# Altium schematic symbol library 16.3 - TTL74系列.SchLib: 649 symbols (part 4 of 6) (continued)
## SN74LS78A (continued)
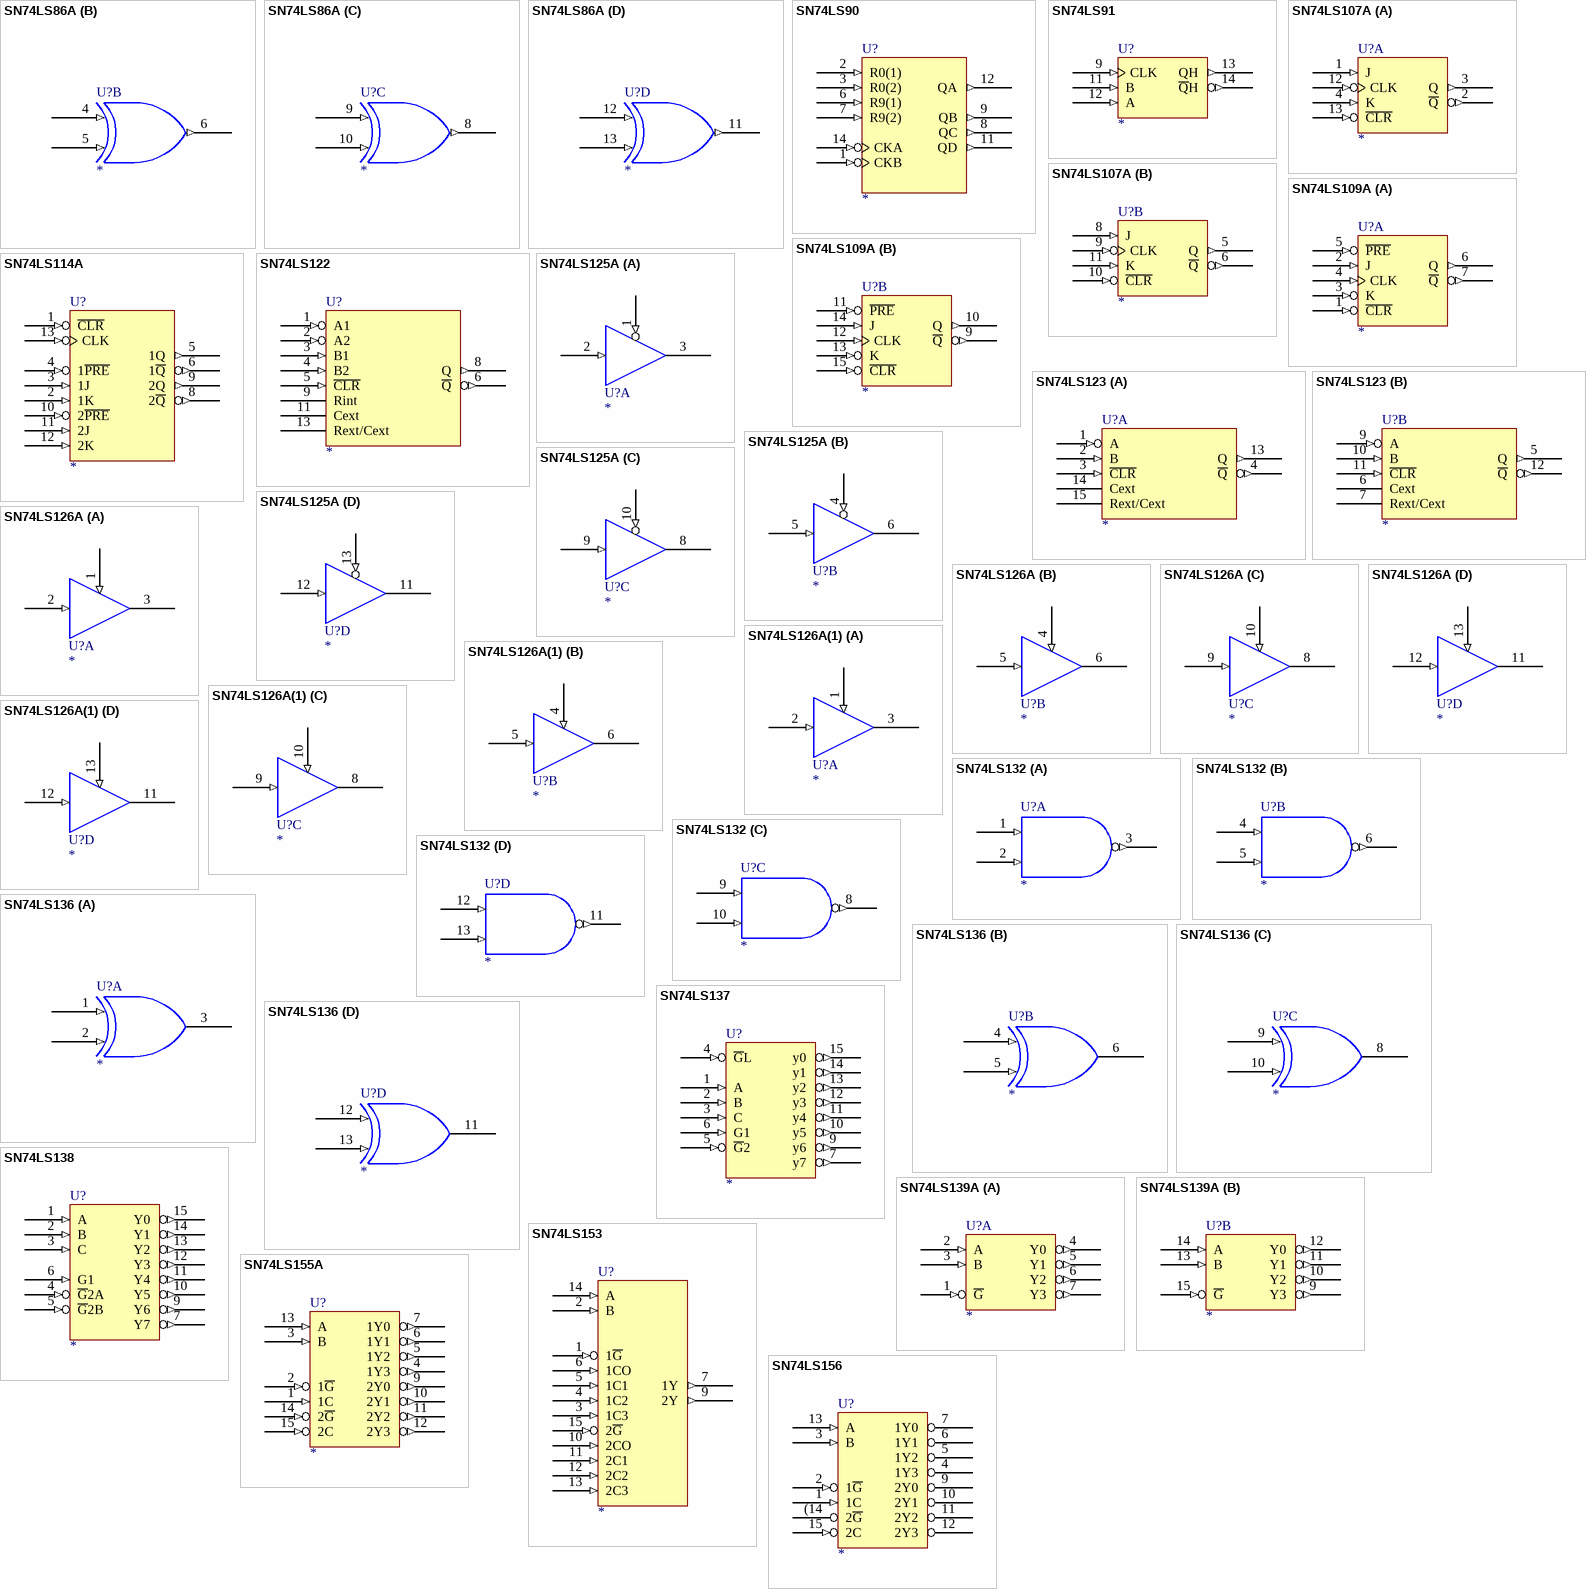
[diagram p19: symbols SN74LS86A to SN74LS156]

## SN74LS86A
designator U?
QUAD 2-IN XOR  G
footprint SO14
footprint DIP-14
part A pins: 1 (in), 2 (in), 3 (out), 7 GND (power) hidden to GND, 14 VCC (power) hidden to VCC
part B pins: 4 (in), 5 (in), 6 (out), 7 GND (power) hidden to GND, 14 VCC (power) hidden to VCC
part C pins: 7 GND (power) hidden to GND, 8 (out), 9 (in), 10 (in), 14 VCC (power) hidden to VCC
part D pins: 7 GND (power) hidden to GND, 11 (out), 12 (in), 13 (in), 14 VCC (power) hidden to VCC
1 alternate drawing of the same symbol

## SN74LS90
designator U?
DECADE DIV-BY-12 BIN CNT
footprint SO14
footprint DIP-14
pins: 1 CKB (in), 2 R0(1) (in), 3 R0(2) (in), 5 VCC (power) hidden to VCC, 6 R9(1) (in), 7 R9(2) (in), 8 QC (out), 9 QB (out), 10 GND (power) hidden to GND, 11 QD (out), 12 QA (out), 14 CKA (in)
1 alternate drawing of the same symbol

## SN74LS91
designator U?
8-BIT SHIFT REG
footprint SO14
footprint DIP-14
pins: 5 VCC (power) hidden to VCC, 9 CLK (in), 10 GND (power) hidden to GND, 11 B (in), 12 A (in), 13 QH (out), 14 ~{Q}H (out)
1 alternate drawing of the same symbol

## SN74LS107A
designator U?
DUAL J-K FF CR
footprint SO14
footprint DIP-14
part A pins: 1 J (in), 2 ~{Q} (out), 3 Q (out), 4 K (in), 7 GND (power) hidden to GND, 12 CLK (in), 13 ~{CLR} (in), 14 VCC (power) hidden to VCC
part B pins: 5 Q (out), 6 ~{Q} (out), 7 GND (power) hidden to GND, 8 J (in), 9 CLK (in), 10 ~{CLR} (in), 11 K (in), 14 VCC (power) hidden to VCC
1 alternate drawing of the same symbol

## SN74LS109A
designator U?
DUAL J-K PET FF RS CR
footprint SO16
footprint DIP-16
part A pins: 1 ~{CLR} (in), 2 J (in), 3 K (in), 4 CLK (in), 5 ~{PRE} (in), 6 Q (out), 7 ~{Q} (out), 8 GND (power) hidden to GND, 16 VCC (power) hidden to VCC
part B pins: 8 GND (power) hidden to GND, 9 ~{Q} (out), 10 Q (out), 11 ~{PRE} (in), 12 CLK (in), 13 K (in), 14 J (in), 15 ~{CLR} (in), 16 VCC (power) hidden to VCC
1 alternate drawing of the same symbol

## SN74LS114A
designator U?
DUAL J-K NET FF RS COM CR COM CLK
footprint SO14
footprint DIP-14
pins: 1 ~{CLR} (in), 2 1K (in), 3 1J (in), 4 1~{PRE} (in), 5 1Q (out), 6 1~{Q} (out), 7 GND (power) hidden to GND, 8 2~{Q} (out), 9 2Q (out), 10 2~{PRE} (in), 11 2J (in), 12 2K (in), 13 CLK (in), 14 VCC (power) hidden to VCC
1 alternate drawing of the same symbol

## SN74LS122
designator U?
RETRIGGERABLE MONOSTABLE MULTIVIBRATOR
footprint SO14
footprint DIP-14
pins: 1 A1 (in), 2 A2 (in), 3 B1 (in), 4 B2 (in), 5 ~{CLR} (in), 6 ~{Q} (out), 7 GND (power) hidden to GND, 8 Q (out), 9 Rint, 11 Cext, 13 Rext/Cext, 14 VCC (power) hidden to VCC
1 alternate drawing of the same symbol

## SN74LS123
designator U?
RETRIGGERABLE MONOSTABLE MULTIVIBRATOR
footprint SO16
footprint DIP-16
part A pins: 1 A (in), 2 B (in), 3 ~{CLR} (in), 4 ~{Q} (out), 8 GND (power) hidden to GND, 13 Q (out), 14 Cext, 15 Rext/Cext, 16 VCC (power) hidden to VCC
part B pins: 5 Q (out), 6 Cext, 7 Rext/Cext, 8 GND (power) hidden to GND, 9 A (in), 10 B (in), 11 ~{CLR} (in), 12 ~{Q} (out), 16 VCC (power) hidden to VCC
1 alternate drawing of the same symbol

## SN74LS125A
designator U?
QUAD BUS BUF 3SO
footprint SO14
footprint DIP-14
part A pins: 1 (in), 2 (in), 3 (hiz), 7 GND (power) hidden to GND, 14 VCC (power) hidden to VCC
part B pins: 4 (in), 5 (in), 6 (hiz), 7 GND (power) hidden to GND, 14 VCC (power) hidden to VCC
part C pins: 7 GND (power) hidden to GND, 8 (hiz), 9 (in), 10 (in), 14 VCC (power) hidden to VCC
part D pins: 7 GND (power) hidden to GND, 11 (hiz), 12 (in), 13 (in), 14 VCC (power) hidden to VCC
2 alternate drawings of the same symbol

## SN74LS126A
designator U?
QUAD BUS BUF 3SO
footprint SO14
footprint DIP-14
part A pins: 1 (in), 2 (in), 3 (hiz), 7 GND (power) hidden to GND, 14 VCC (power) hidden to VCC
part B pins: 4 (in), 5 (in), 6 (hiz), 7 GND (power) hidden to GND, 14 VCC (power) hidden to VCC
part C pins: 7 GND (power) hidden to GND, 8 (hiz), 9 (in), 10 (in), 14 VCC (power) hidden to VCC
part D pins: 7 GND (power) hidden to GND, 11 (hiz), 12 (in), 13 (in), 14 VCC (power) hidden to VCC
2 alternate drawings of the same symbol

## SN74LS126A(1)
designator U?
QUAD BUS BUF 3SO
footprint DIP-14
part A pins: 1 (in), 2 (in), 3 (hiz), 7 GND (power) hidden to GND, 14 VCC (power) hidden to VCC
part B pins: 4 (in), 5 (in), 6 (hiz), 7 GND (power) hidden to GND, 14 VCC (power) hidden to VCC
part C pins: 7 GND (power) hidden to GND, 8 (hiz), 9 (in), 10 (in), 14 VCC (power) hidden to VCC
part D pins: 7 GND (power) hidden to GND, 11 (hiz), 12 (in), 13 (in), 14 VCC (power) hidden to VCC
2 alternate drawings of the same symbol

## SN74LS132
designator U?
QUAD 2-IN POS NAND SCH
footprint SO14
footprint DIP-14
part A pins: 1 (in), 2 (in), 3 (out), 7 GND (power) hidden to GND, 14 VCC (power) hidden to VCC
part B pins: 4 (in), 5 (in), 6 (out), 7 GND (power) hidden to GND, 14 VCC (power) hidden to VCC
part C pins: 7 GND (power) hidden to GND, 8 (out), 9 (in), 10 (in), 14 VCC (power) hidden to VCC
part D pins: 7 GND (power) hidden to GND, 11 (out), 12 (in), 13 (in), 14 VCC (power) hidden to VCC
2 alternate drawings of the same symbol

## SN74LS136
designator U?
QUAD 2-IN XOR  G OCO
footprint DIP-14
part A pins: 1 (in), 2 (in), 3 (oc), 7 GND (power) hidden to GND, 14 VCC (power) hidden to VCC
part B pins: 4 (in), 5 (in), 6 (oc), 7 GND (power) hidden to GND, 14 VCC (power) hidden to VCC
part C pins: 7 GND (power) hidden to GND, 8 (oc), 9 (in), 10 (in), 14 VCC (power) hidden to VCC
part D pins: 7 GND (power) hidden to GND, 11 (oc), 12 (in), 13 (in), 14 VCC (power) hidden to VCC
1 alternate drawing of the same symbol

## SN74LS137
designator U?
3-8LINE DEC/DEMUL ADDRESS LCH
footprint SO16
footprint DIP-16
pins: 1 A (in), 2 B (in), 3 C (in), 4 ~{G}L (in), 5 ~{G}2 (in), 6 G1 (in), 7 y7 (out), 8 GND (power) hidden to GND, 9 y6 (out), 10 y5 (out), 11 y4 (out), 12 y3 (out), 13 y2 (out), 14 y1 (out), 15 y0 (out), 16 VCC (power) hidden to VCC
1 alternate drawing of the same symbol

## SN74LS138
designator U?
3-8LINE DEC/DEMUL
footprint SO16
footprint DIP-16
pins: 1 A (in), 2 B (in), 3 C (in), 4 ~{G}2A (in), 5 ~{G}2B (in), 6 G1 (in), 7 Y7 (out), 8 GND (power) hidden to GND, 9 Y6 (out), 10 Y5 (out), 11 Y4 (out), 12 Y3 (out), 13 Y2 (out), 14 Y1 (out), 15 Y0 (out), 16 VCC (power) hidden to VCC
1 alternate drawing of the same symbol

## SN74LS139A
designator U?
DUAL 2-4LINE DEC/DEMULT
footprint SO16
footprint DIP-16
part A pins: 1 ~{G} (in), 2 A (in), 3 B (in), 4 Y0 (out), 5 Y1 (out), 6 Y2 (out), 7 Y3 (out), 8 GND (power) hidden to GND, 16 VCC (power) hidden to VCC
part B pins: 8 GND (power) hidden to GND, 9 Y3 (out), 10 Y2 (out), 11 Y1 (out), 12 Y0 (out), 13 B (in), 14 A (in), 15 ~{G} (in), 16 VCC (power) hidden to VCC
1 alternate drawing of the same symbol

## SN74LS153
designator U?
DUAL 4-1 LINE DATA SELEC/MUX
footprint SO16
footprint DIP-16
pins: 1 1~{G} (in), 2 B (in), 3 1C3 (in), 4 1C2 (in), 5 1C1 (in), 6 1CO (in), 7 1Y (out), 8 GND (power) hidden to GND, 9 2Y (out), 10 2CO (in), 11 2C1 (in), 12 2C2 (in), 13 2C3 (in), 14 A (in), 15 2~{G} (in), 16 VCC (power) hidden to VCC
1 alternate drawing of the same symbol

## SN74LS155A
designator U?
DUAL 2-4 LINE DEC/DEMUL
footprint SO16
footprint DIP-16
pins: 1 1C (in), 2 1~{G} (in), 3 B (in), 4 1Y3 (out), 5 1Y2 (out), 6 1Y1 (out), 7 1Y0 (out), 8 GND (power) hidden to GND, 9 2Y0 (out), 10 2Y1 (out), 11 2Y2 (out), 12 2Y3 (out), 13 A (in), 14 2~{G} (in), 15 2C (in), 16 VCC (power) hidden to VCC
1 alternate drawing of the same symbol

## SN74LS156
designator U?
DUAL 2-4 LINE DEC/DEMUL
footprint DIP-16
pins: 1 1C (in), 2 1~{G} (in), 3 B (in), 4 1Y3 (oc), 5 1Y2 (oc), 6 1Y1 (oc), 7 1Y0 (oc), 8 GND (power) hidden to GND, 9 2Y0 (oc), 10 2Y1 (oc), 11 2Y2 (oc), 12 2Y3 (oc), 13 A (in), 15 2C (in), 16 VCC (power) hidden to VCC, (14 2~{G}
1 alternate drawing of the same symbol

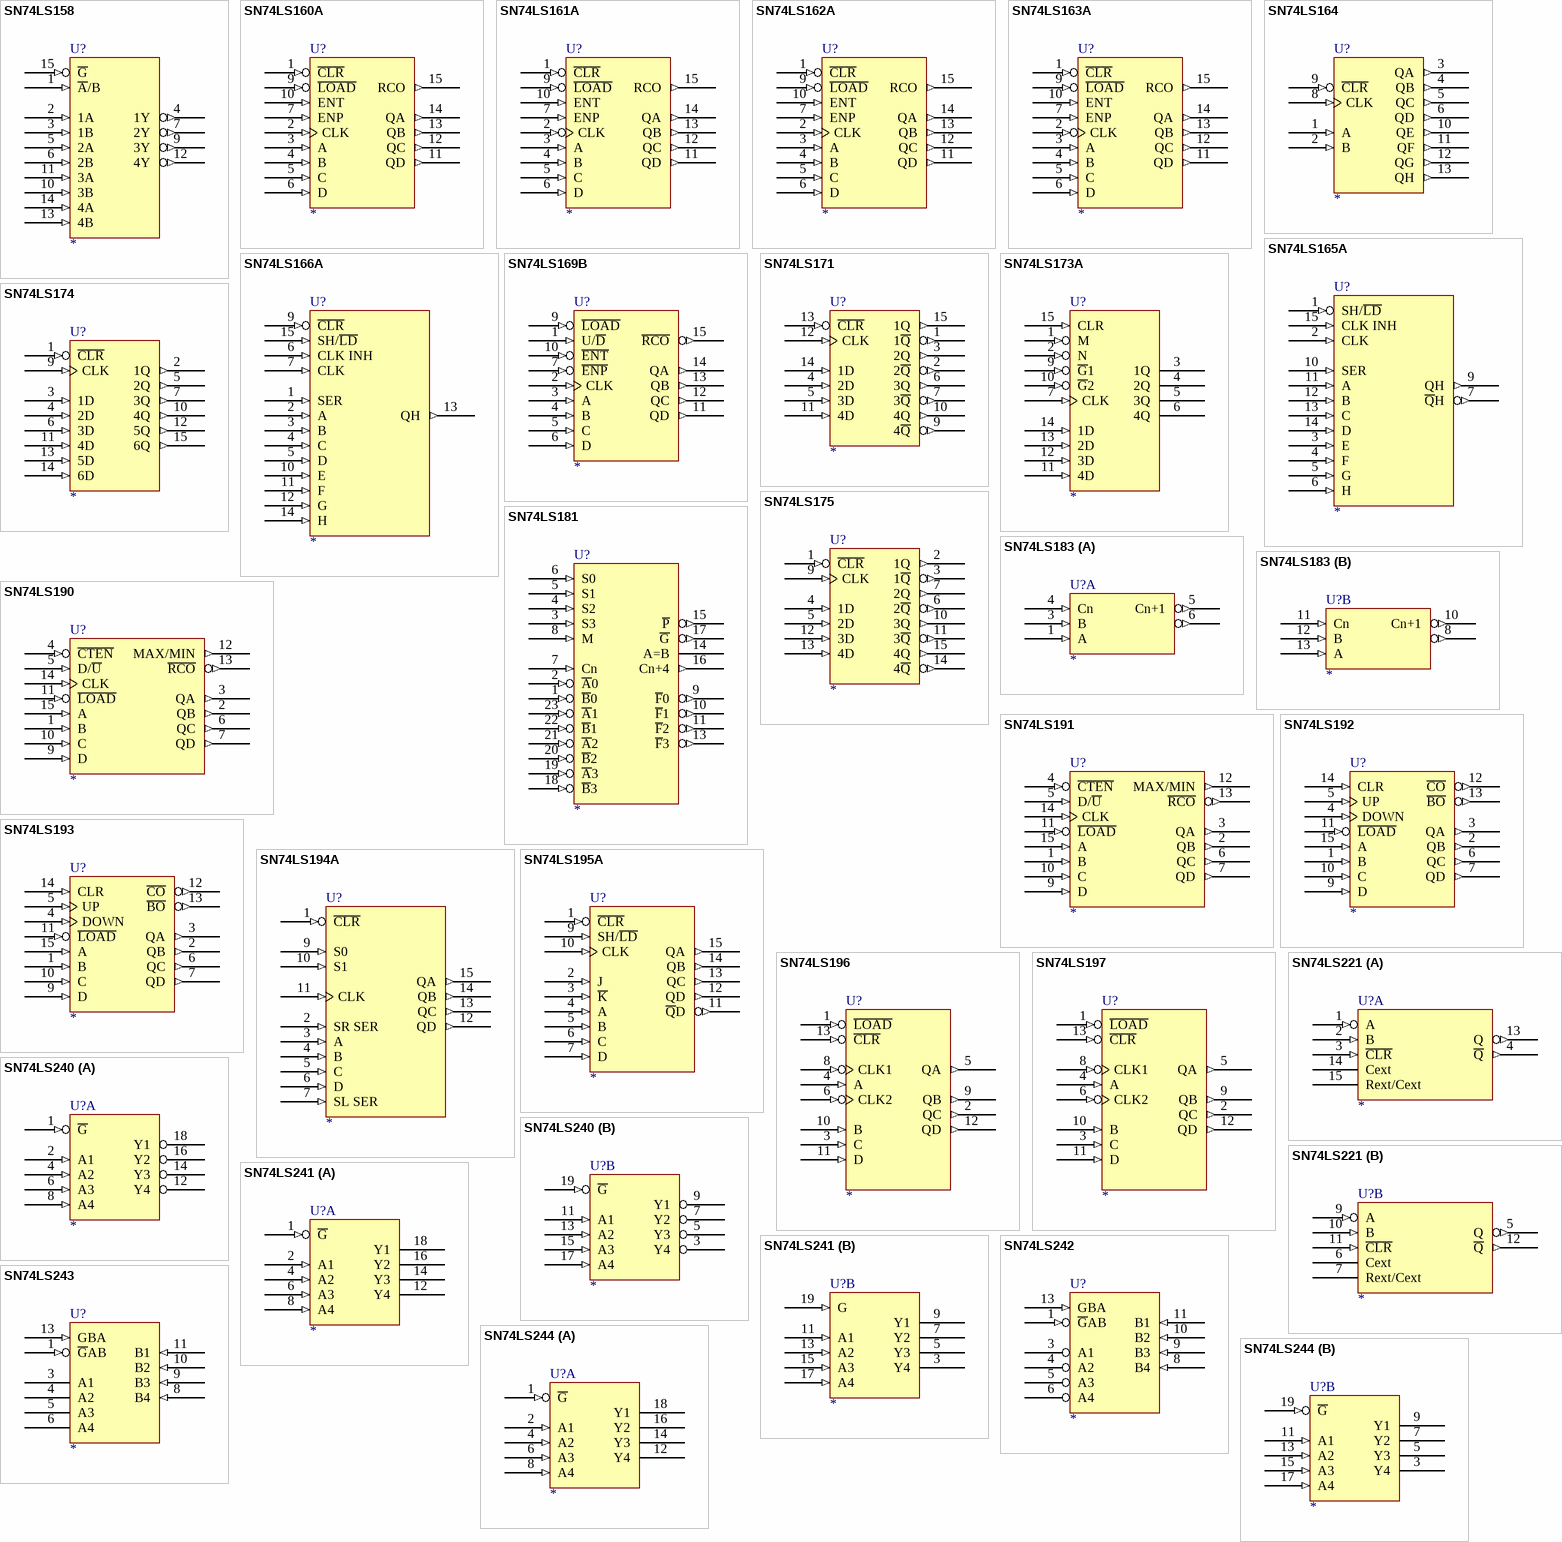
[diagram p20: symbols SN74LS158 to SN74LS244]

## SN74LS158
designator U?
QUAD 2-1LINE DATA SELEC/MUX
footprint SO16
footprint DIP-16
pins: 1 ~{A}/B (in), 2 1A (in), 3 1B (in), 4 1Y (out), 5 2A (in), 6 2B (in), 7 2Y (out), 8 GND (power) hidden to GND, 9 3Y (out), 10 3B (in), 11 3A (in), 12 4Y (out), 13 4B (in), 14 4A (in), 15 ~{G} (in), 16 VCC (power) hidden to VCC
1 alternate drawing of the same symbol

## SN74LS160A
designator U?
SYN 4-BIT CNT
footprint SO16
footprint DIP-16
pins: 1 ~{CLR} (in), 2 CLK (in), 3 A (in), 4 B (in), 5 C (in), 6 D (in), 7 ENP (in), 8 GND (power) hidden to GND, 9 ~{LOAD} (in), 10 ENT (in), 11 QD (out), 12 QC (out), 13 QB (out), 14 QA (out), 15 RCO (out), 16 VCC (power) hidden to VCC
1 alternate drawing of the same symbol

## SN74LS161A
designator U?
SYN 4-BIT CNT
footprint DIP-16
footprint SO16
pins: 1 ~{CLR} (in), 2 CLK (in), 3 A (in), 4 B (in), 5 C (in), 6 D (in), 7 ENP (in), 8 GND (power) hidden to GND, 9 ~{LOAD} (in), 10 ENT (in), 11 QD (out), 12 QC (out), 13 QB (out), 14 QA (out), 15 RCO (out), 16 VCC (power) hidden to VCC
1 alternate drawing of the same symbol

## SN74LS162A
designator U?
SYN 4-BIT CNT
footprint SO16
footprint DIP-16
pins: 1 ~{CLR} (in), 2 CLK (in), 3 A (in), 4 B (in), 5 C (in), 6 D (in), 7 ENP (in), 8 GND (power) hidden to GND, 9 ~{LOAD} (in), 10 ENT (in), 11 QD (out), 12 QC (out), 13 QB (out), 14 QA (out), 15 RCO (out), 16 VCC (power) hidden to VCC
1 alternate drawing of the same symbol

## SN74LS163A
designator U?
SYN 4-BIT CNT
footprint SO16
footprint DIP-16
pins: 1 ~{CLR} (in), 2 CLK (in), 3 A (in), 4 B (in), 5 C (in), 6 D (in), 7 ENP (in), 8 GND (power) hidden to GND, 9 ~{LOAD} (in), 10 ENT (in), 11 QD (out), 12 QC (out), 13 QB (out), 14 QA (out), 15 RCO (out), 16 VCC (power) hidden to VCC
1 alternate drawing of the same symbol

## SN74LS164
designator U?
8-BIT PALL SERI SFT REG
footprint SO14
footprint DIP-14
pins: 1 A (in), 2 B (in), 3 QA (out), 4 QB (out), 5 QC (out), 6 QD (out), 7 GND (power) hidden to GND, 8 CLK (in), 9 ~{CLR} (in), 10 QE (out), 11 QF (out), 12 QG (out), 13 QH (out), 14 VCC (power) hidden to VCC
1 alternate drawing of the same symbol

## SN74LS165A
designator U?
PALL LOAD 8-BIT SFT REG
footprint SO16
footprint DIP-16
pins: 1 SH/~{LD} (in), 2 CLK (in), 3 E (in), 4 F (in), 5 G (in), 6 H (in), 7 ~{Q}H (out), 8 GND (power) hidden to GND, 9 QH (out), 10 SER (in), 11 A (in), 12 B (in), 13 C (in), 14 D (in), 15 CLK INH (in), 16 VCC (power) hidden to VCC
1 alternate drawing of the same symbol

## SN74LS166A
designator U?
PALL LOAD 8-BIT SFT REG
footprint DIP-16
footprint SO16
pins: 1 SER (in), 2 A (in), 3 B (in), 4 C (in), 5 D (in), 6 CLK INH (in), 7 CLK (in), 8 GND (power) hidden to GND, 9 ~{CLR} (in), 10 E (in), 11 F (in), 12 G (in), 13 QH (out), 14 H (in), 15 SH/~{LD} (in), 16 VCC (power) hidden to VCC
1 alternate drawing of the same symbol

## SN74LS169B
designator U?
SYN 4-BIT UP/DOWN BIN CNT
footprint SO16
footprint DIP-16
pins: 1 U/~{D} (in), 2 CLK (in), 3 A (in), 4 B (in), 5 C (in), 6 D (in), 7 ~{ENP} (in), 8 GND (power) hidden to GND, 9 ~{LOAD} (in), 10 ~{ENT} (in), 11 QD (out), 12 QC (out), 13 QB (out), 14 QA (out), 15 ~{RCO} (out), 16 VCC (power) hidden to VCC
1 alternate drawing of the same symbol

## SN74LS171
designator U?
QUAD D-TYPE FF CR
footprint SO16
footprint DIP-16
pins: 1 1~{Q} (out), 2 2~{Q} (out), 3 2Q (out), 4 2D (in), 5 3D (in), 6 3Q (out), 7 3~{Q} (out), 8 GND (power) hidden to GND, 9 4~{Q} (out), 10 4Q (out), 11 4D (in), 12 CLK (in), 13 ~{CLR} (in), 14 1D (in), 15 1Q (out), 16 VCC (power) hidden to VCC
1 alternate drawing of the same symbol

## SN74LS173A
designator U?
4-BIT D-TYPE REG 3SO
footprint SO16
footprint DIP-16
pins: 1 M (in), 2 N (in), 3 1Q (hiz), 4 2Q (hiz), 5 3Q (hiz), 6 4Q (hiz), 7 CLK (in), 8 GND (power) hidden to GND, 9 ~{G}1 (in), 10 ~{G}2 (in), 11 4D (in), 12 3D (in), 13 2D (in), 14 1D (in), 15 CLR (in), 16 VCC (power) hidden to VCC
1 alternate drawing of the same symbol

## SN74LS174
designator U?
HEX D-TYPE FF CR
footprint SO16
footprint DIP-16
pins: 1 ~{CLR} (in), 2 1Q (out), 3 1D (in), 4 2D (in), 5 2Q (out), 6 3D (in), 7 3Q (out), 8 GND (power) hidden to GND, 9 CLK (in), 10 4Q (out), 11 4D (in), 12 5Q (out), 13 5D (in), 14 6D (in), 15 6Q (out), 16 VCC (power) hidden to VCC
1 alternate drawing of the same symbol

## SN74LS175
designator U?
QUAD D-TYPE FF CR
footprint SO16
footprint DIP-16
pins: 1 ~{CLR} (in), 2 1Q (out), 3 1~{Q} (out), 4 1D (in), 5 2D (in), 6 2~{Q} (out), 7 2Q (out), 8 GND (power) hidden to GND, 9 CLK (in), 10 3Q (out), 11 3~{Q} (out), 12 3D (in), 13 4D (in), 14 4~{Q} (out), 15 4Q (out), 16 VCC (power) hidden to VCC
1 alternate drawing of the same symbol

## SN74LS181
designator U?
ALU/FN GNR
footprint SO24W
footprint DIP-24
pins: 1 ~{B}0 (in), 2 ~{A}0 (in), 3 S3 (in), 4 S2 (in), 5 S1 (in), 6 S0 (in), 7 Cn (in), 8 M (in), 9 ~{F}0 (out), 10 ~{F}1 (out), 11 ~{F}2 (out), 12 GND (power) hidden to GND, 13 ~{F}3 (out), 14 A=B (oc), 15 ~{P} (out), 16 Cn+4 (out), 17 ~{G} (out), 18 ~{B}3 (in), 19 ~{A}3 (in), 20 ~{B}2 (in), 21 ~{A}2 (in), 22 ~{B}1 (in), 23 ~{A}1 (in), 24 VCC (power) hidden to VCC
1 alternate drawing of the same symbol

## SN74LS183
designator U?
DUAL CARRY-SAVE FULL ADD
footprint DIP-14
part A pins: 1 A (in), 3 B (in), 4 Cn (in), 5 Cn+1 (out), 6 (out), 7 GND (power) hidden to GND, 14 VCC (power) hidden to VCC
part B pins: 7 GND (power) hidden to GND, 8 (out), 10 Cn+1 (out), 11 Cn (in), 12 B (in), 13 A (in), 14 VCC (power) hidden to VCC
1 alternate drawing of the same symbol

## SN74LS190
designator U?
SYN UP/DOWN CNT DOWN/UP MODE CONTTOL
footprint DIP-16
footprint SO16
pins: 1 B (in), 2 QB (out), 3 QA (out), 4 ~{CTEN} (in), 5 D/~{U} (in), 6 QC (out), 7 QD (out), 8 GND (power) hidden to GND, 9 D (in), 10 C (in), 11 ~{LOAD} (in), 12 MAX/MIN (out), 13 ~{RCO} (out), 14 CLK (in), 15 A (in), 16 VCC (power) hidden to VCC
1 alternate drawing of the same symbol

## SN74LS191
designator U?
SYN UP/DOWN CNT DOWN/UP MODE CONTTOL
footprint SO16
footprint DIP-16
pins: 1 B (in), 2 QB (out), 3 QA (out), 4 ~{CTEN} (in), 5 D/~{U} (in), 6 QC (out), 7 QD (out), 8 GND (power) hidden to GND, 9 D (in), 10 C (in), 11 ~{LOAD} (in), 12 MAX/MIN (out), 13 ~{RCO} (out), 14 CLK (in), 15 A (in), 16 VCC (power) hidden to VCC
1 alternate drawing of the same symbol

## SN74LS192
designator U?
SYN 4-BIT UP/DOWN CNT DUAL CLK CR
footprint SO16
footprint DIP-16
pins: 1 B (in), 2 QB (out), 3 QA (out), 4 DOWN (in), 5 UP (in), 6 QC (out), 7 QD (out), 8 GND (power) hidden to GND, 9 D (in), 10 C (in), 11 ~{LOAD} (in), 12 ~{CO} (out), 13 ~{BO} (out), 14 CLR (in), 15 A (in), 16 VCC (power) hidden to VCC
1 alternate drawing of the same symbol

## SN74LS193
designator U?